# Altium footprint library SparkFun.PCBLIB: 674 footprints (part 39 of 44)
Each footprint in its own frame and in the unit in brackets; x right, y up, seen from the top. Pads: shape width x height; smd on the part's side, far side on the other; paste and mask are expansions set on the pad; w line width, h text height; cw(c..) or ccw(c..) is an arc to the next point about the centre after c.
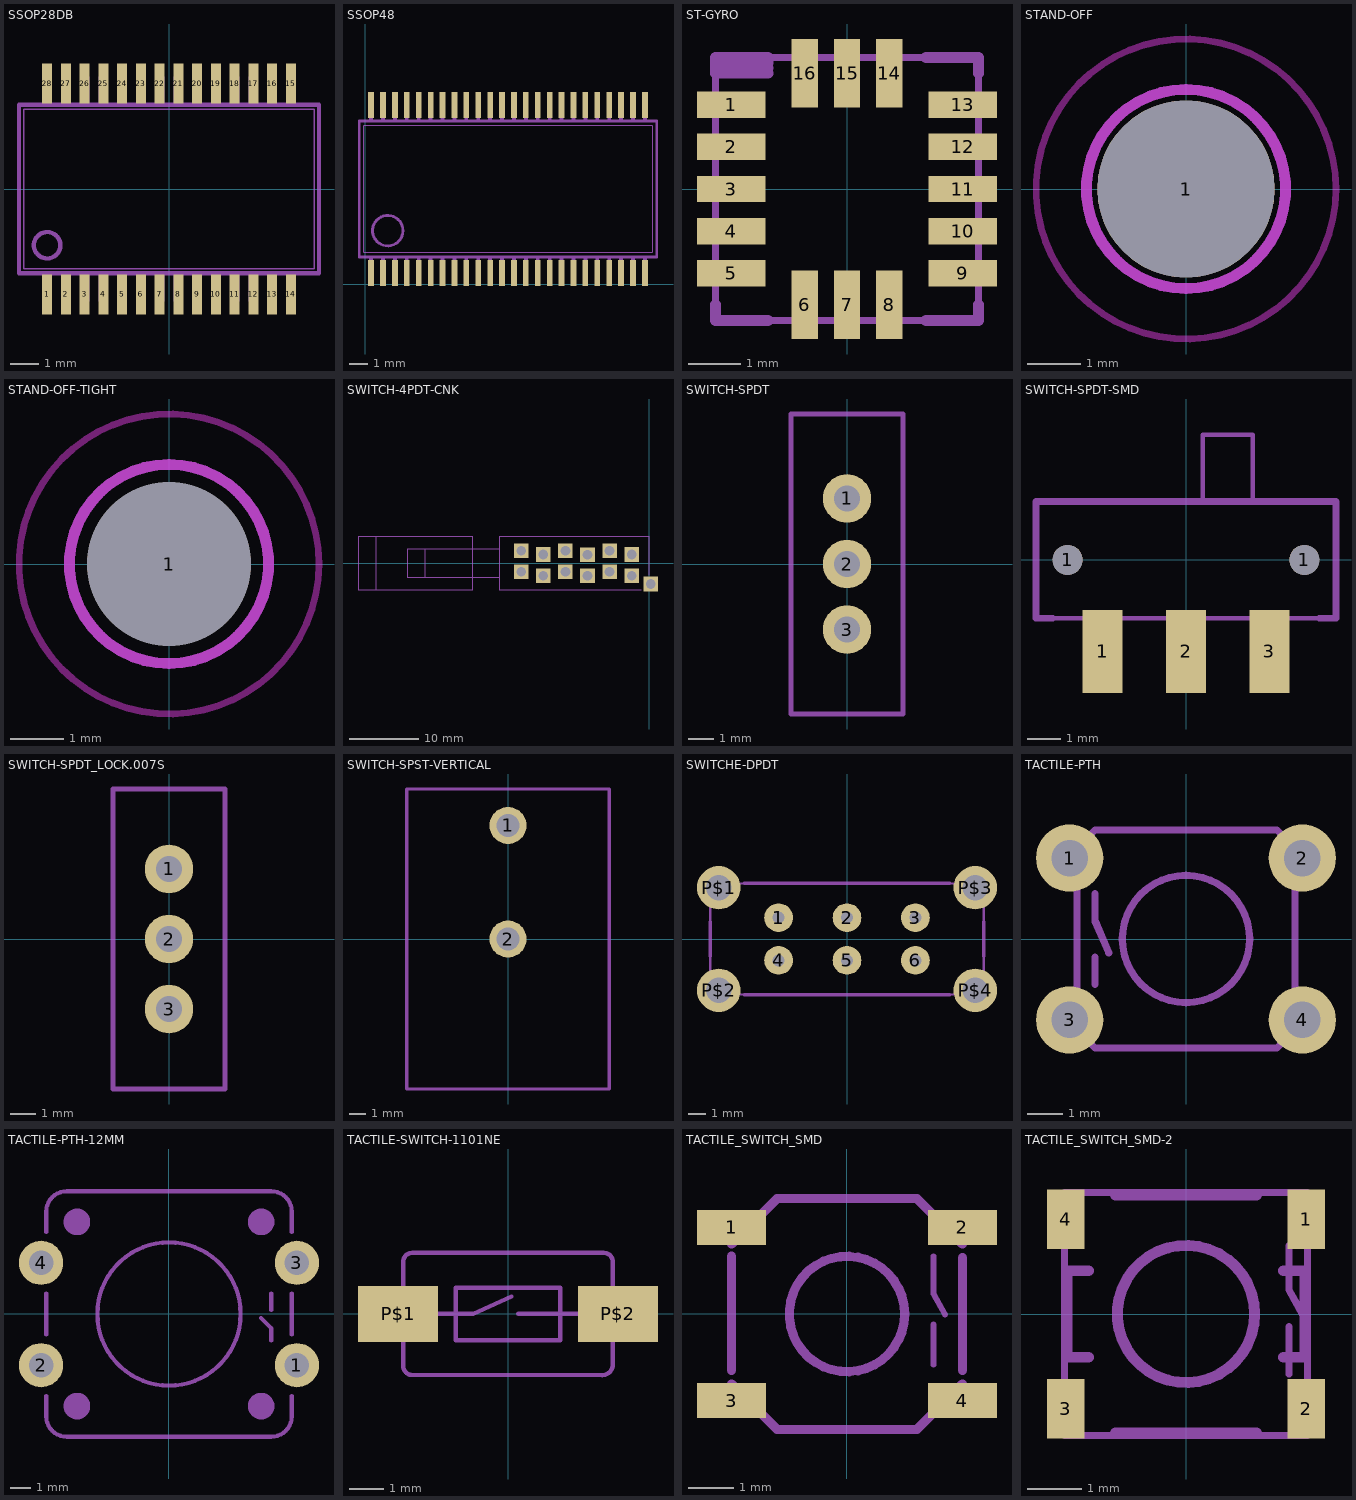
[diagram p38: the footprints below, top view; thin cyan lines are the x and y axes]

## SSOP28DB [mil]
pads (28):
  rect 13.7x55 smd: 1(-166.34,-143.94) 2(-140.75,-143.94) 3(-115.16,-143.94) 4(-89.57,-143.94) 5(-63.98,-143.94) 6(-38.39,-143.94) 7(-12.8,-143.94) 8(12.8,-143.94) 9(38.39,-143.94) 10(63.98,-143.94) 11(89.57,-143.94) 12(115.16,-143.94) 13(140.75,-143.94) 14(166.34,-143.94) 15(166.34,143.94) 16(140.75,143.94) 17(115.16,143.94) 18(89.57,143.94) 19(63.98,143.94) 20(38.39,143.94) 21(12.8,143.94) 22(-12.8,143.94) 23(-38.39,143.94) 24(-63.98,143.94) 25(-89.57,143.94) 26(-115.16,143.94) 27(-140.75,143.94) 28(-166.34,143.94)
Mechanical 2:
  circle w6: c-166.34,-76.77 r18.09
  lines w6: -204.72,-115.16 204.72,-115.16 204.72,115.16 -204.72,115.16 -204.72,-115.16
Mechanical 6:
  lines w2: -198.35,-108.78 198.35,-108.78 198.35,108.78 -198.35,108.78 -198.35,-108.78
Mechanical 18:
  rectangle: -172.74,116.76 -159.94,153.54
  rectangle: -172.74,-153.54 -159.94,-116.76
  rectangle: -147.15,-153.54 -134.35,-116.76
  rectangle: -121.56,-153.54 -108.76,-116.76
  rectangle: -147.15,116.76 -134.35,153.54
  rectangle: -121.56,116.76 -108.76,153.54
  rectangle: -95.96,116.76 -83.17,153.54
  rectangle: -70.37,116.76 -57.58,153.54
  rectangle: -44.78,116.76 -31.99,153.54
  rectangle: -19.19,116.76 -6.4,153.54
  rectangle: 6.4,116.76 19.19,153.54
  rectangle: 31.99,116.76 44.78,153.54
  rectangle: 57.58,116.76 70.37,153.54
  rectangle: 83.17,116.76 95.96,153.54
  rectangle: 108.76,116.76 121.56,153.54
  rectangle: 134.35,116.76 147.15,153.54
  rectangle: 159.94,116.76 172.74,153.54
  rectangle: -95.96,-153.54 -83.17,-116.76
  rectangle: -70.37,-153.54 -57.58,-116.76
  rectangle: -44.78,-153.54 -31.99,-116.76
  rectangle: -19.19,-153.54 -6.4,-116.76
  rectangle: 6.4,-153.54 19.19,-116.76
  rectangle: 31.99,-153.54 44.78,-116.76
  rectangle: 57.58,-153.54 70.37,-116.76
  rectangle: 83.17,-153.54 95.96,-116.76
  rectangle: 108.76,-153.54 121.56,-116.76
  rectangle: 134.35,-153.54 147.15,-116.76
  rectangle: 159.94,-153.54 172.74,-116.76

## SSOP48 [mil]
pads (48):
  rect 12x55 smd: 1(12.5,23.5) 2(37.5,23.5) 3(62.5,23.5) 4(87.5,23.5) 5(112.5,23.5) 6(137.5,23.5) 7(162.5,23.5) 8(187.5,23.5) 9(212.5,23.5) 10(237.5,23.5) 11(262.5,23.5) 12(287.5,23.5) 13(312.5,23.5) 14(337.5,23.5) 15(362.5,23.5) 16(387.5,23.5) 17(412.5,23.5) 18(437.5,23.5) 19(462.5,23.5) 20(487.5,23.5) 21(512.5,23.5) 22(537.5,23.5) 23(562.5,23.5) 24(587.5,23.5) 25(587.5,376.5) 26(562.5,376.5) 27(537.5,376.5) 28(512.5,376.5) 29(487.5,376.5) 30(462.5,376.5) 31(437.5,376.5) 32(412.5,376.5) 33(387.5,376.5) 34(362.5,376.5) 35(337.5,376.5) 36(312.5,376.5) 37(287.5,376.5) 38(262.5,376.5) 39(237.5,376.5) 40(212.5,376.5) 41(187.5,376.5) 42(162.5,376.5) 43(137.5,376.5) 44(112.5,376.5) 45(87.5,376.5) 46(62.5,376.5) 47(37.5,376.5) 48(12.5,376.5)
Mechanical 2:
  circle w6: c47.5,112.5 r32
  lines w2: -2.52,67.48 602.52,67.48 602.52,332.52 -2.52,332.52 -2.52,67.48
  lines w6: -12.52,57.48 612.52,57.48 612.52,342.52 -12.52,342.52 -12.52,57.48
Mechanical 18:
  rectangle: 8.5,344.5 16.5,377.5
  rectangle: 33.5,344.5 41.5,377.5
  rectangle: 58.5,344.5 66.5,377.5
  rectangle: 83.5,344.5 91.5,377.5
  rectangle: 108.5,344.5 116.5,377.5
  rectangle: 133.5,344.5 141.5,377.5
  rectangle: 158.5,344.5 166.5,377.5
  rectangle: 183.5,344.5 191.5,377.5
  rectangle: 208.5,344.5 216.5,377.5
  rectangle: 233.5,344.5 241.5,377.5
  rectangle: 258.5,344.5 266.5,377.5
  rectangle: 283.5,344.5 291.5,377.5
  rectangle: 308.5,344.5 316.5,377.5
  rectangle: 333.5,344.5 341.5,377.5
  rectangle: 358.5,344.5 366.5,377.5
  rectangle: 383.5,344.5 391.5,377.5
  rectangle: 408.5,344.5 416.5,377.5
  rectangle: 433.5,344.5 441.5,377.5
  rectangle: 458.5,344.5 466.5,377.5
  rectangle: 483.5,344.5 491.5,377.5
  rectangle: 508.5,344.5 516.5,377.5
  rectangle: 533.5,344.5 541.5,377.5
  rectangle: 558.5,344.5 566.5,377.5
  rectangle: 583.5,344.5 591.5,377.5
  rectangle: 583.5,22.5 591.5,55.5
  rectangle: 558.5,22.5 566.5,55.5
  rectangle: 533.5,22.5 541.5,55.5
  rectangle: 508.5,22.5 516.5,55.5
  rectangle: 483.5,22.5 491.5,55.5
  rectangle: 458.5,22.5 466.5,55.5
  rectangle: 433.5,22.5 441.5,55.5
  rectangle: 408.5,22.5 416.5,55.5
  rectangle: 383.5,22.5 391.5,55.5
  rectangle: 358.5,22.5 366.5,55.5
  rectangle: 333.5,22.5 341.5,55.5
  rectangle: 308.5,22.5 316.5,55.5
  rectangle: 283.5,22.5 291.5,55.5
  rectangle: 258.5,22.5 266.5,55.5
  rectangle: 233.5,22.5 241.5,55.5
  rectangle: 208.5,22.5 216.5,55.5
  rectangle: 183.5,22.5 191.5,55.5
  rectangle: 158.5,22.5 166.5,55.5
  rectangle: 133.5,22.5 141.5,55.5
  rectangle: 108.5,22.5 116.5,55.5
  rectangle: 83.5,22.5 91.5,55.5
  rectangle: 58.5,22.5 66.5,55.5
  rectangle: 33.5,22.5 41.5,55.5
  rectangle: 8.5,22.5 16.5,55.5

## ST-GYRO [mil]
pads (16):
  rect 51.18x19.69 smd: 1(-86.61,62.99) 2(-86.61,31.5) 3(-86.61,0) 4(-86.61,-31.5) 5(-86.61,-62.99) 9(86.61,-62.99) 10(86.61,-31.5) 11(86.61,0) 12(86.61,31.5) 13(86.61,62.99)
  rect 19.69x51.18 smd: 6(-31.5,-86.61) 7(0,-86.61) 8(31.5,-86.61) 14(31.5,86.61) 15(0,86.61) 16(-31.5,86.61)
Mechanical 2:
  lines w8: -98.43,-86.61 -98.43,-98.43 -59.06,-98.43 ; -59.06,86.61 -98.43,86.61 -98.43,90.55 ; -59.06,90.55 -98.43,90.55 ; -59.06,94.49 -98.43,94.49 ; -59.06,98.43 -98.43,98.43 -98.43,94.49 ; 59.06,-98.43 98.43,-98.43 98.43,-86.61 ; 59.06,98.43 98.43,98.43 98.43,86.61 ; -98.43,90.55 -98.43,94.49
Mechanical 18:
  lines w5: -98.43,-98.43 -98.43,98.43 98.43,98.43 98.43,-98.43 -98.43,-98.43

## STAND-OFF [mil]
pads (1):
  round 130 hole 130: 1(0,0)
Keep-Out Layer:
  circle w5: c0,0 r110
Mechanical 10 keep-out:
  lines w8: 0,-73 ccw(c0,0) 0,73 ccw(c0,0) 0,-73
Mechanical 11 keep-out:
  lines w8: 0,-73 ccw(c0,0) 0,73 ccw(c0,0) 0,-73

## STAND-OFF-TIGHT [mil]
pads (1):
  round 120 hole 120: 1(0,0)
Keep-Out Layer:
  circle w5: c0,0 r110
Mechanical 10 keep-out:
  lines w8: 0,-73 ccw(c0,0) 0,73 ccw(c0,0) 0,-73
Mechanical 11 keep-out:
  lines w8: 0,-73 ccw(c0,0) 0,73 ccw(c0,0) 0,-73

## SWITCH-4PDT-CNK [mil]
pads (13):
  rect 82.68x82.68 hole 55.12: P$13(8,-118) PP$1(-725,-49) PP$2(-600,-71) PP$3(-475,-49) PP$4(-350,-71) PP$5(-225,-49) PP$6(-100,-71) PP$7(-725,71) PP$8(-600,49) PP$9(-475,71) PP$10(-350,47) PP$11(-225,71) PP$12(-100,49)
Mechanical 2:
  lines w5: -850,-150 -46,-150 ; -850,-79 -850,79 ; -850,150 0,150 0,-67
Mechanical 16:
  lines w5: -1272,-79 -1271,-79 ; -850,-150 -850,-79 ; -850,79 -850,150
Mechanical 18:
  rectangle: -745.9,-71.6 -704.9,-48.6
  rectangle: -620.5,-71.6 -579.5,-48.6
  rectangle: -495.1,-71.6 -454.1,-48.6
  rectangle: -369.7,-71.6 -328.7,-48.6
  rectangle: -244.3,-71.6 -203.3,-48.6
  rectangle: -118.9,-71.6 -77.9,-48.6
  rectangle: -745.9,47.9 -704.9,70.9
  rectangle: -620.5,47.9 -579.5,70.9
  rectangle: -495.1,47.9 -454.1,70.9
  rectangle: -369.7,47.9 -328.7,70.9
  rectangle: -244.3,47.9 -203.3,70.9
  rectangle: -118.9,47.9 -77.9,70.9
  region: 7.5,-138.5 7.5,-97.5 -15.5,-97.5 -15.5,-138.5
  lines w5: -1272,-79 -1272,79 ; -850,-79 -1271,-79 -1370,-79 -1370,79 -1272,79 ; -850,79 -1272,79 ; -1550,-150 -1550,150 ; -1550,-150 -1000,-150 -1000,150 -1550,150 ; -1550,-150 -1650,-150 -1650,150 -1550,150

## SWITCH-SPDT [mil]
pads (3):
  round 74 hole 40: 1(0,100) 2(0,0) 3(0,-100)
Mechanical 2:
  lines w8: -85.63,-228.94 -85.63,228.94 85.63,228.94 85.63,-228.94 -85.63,-228.94

## SWITCH-SPDT-SMD [mil]
pads (5):
  round 35.43 hole 35.43: 1(-139.76,0) 1(139.76,0)
  rect 47.24x98.43 smd: 1(-98.43,-108.27) 2(0,-108.27) 3(98.43,-108.27)
Mechanical 2:
  lines w8: -157.48,-68.9 -177.17,-68.9 -177.17,68.9 177.17,68.9 177.17,-68.9 157.48,-68.9
Mechanical 18:
  lines w5: 19.69,68.9 78.74,68.9 ; 19.69,68.9 -177.17,68.9 -177.17,-68.9 177.17,-68.9 177.17,68.9 78.74,68.9 ; 19.69,68.9 19.69,147.64 78.74,147.64 78.74,68.9

## SWITCH-SPDT_LOCK.007S [mil]
pads (3):
  round 74 hole 40: 1(0,107) 2(0,0) 3(0,-107)
Mechanical 2:
  lines w8: -85.63,-228.94 -85.63,228.94 85.63,228.94 85.63,-228.94 -85.63,-228.94
Mechanical 18:
  rectangle: -9,-12 9,12
  rectangle: -9,88 9,112
  rectangle: -9,-112 9,-88

## SWITCH-SPST-VERTICAL [mil]
pads (2):
  round 90 hole 55.12: 1(0,275.59) 2(0,0)
Mechanical 2:
  lines w8: -246.06,-364.17 246.06,-364.17 246.06,364.17 -246.06,364.17 -246.06,-364.17

## SWITCHE-DPDT [mil]
pads (10):
  round 66 hole 27.56: 1(-157.48,49.21) 2(0,49.21) 3(157.48,49.21) 4(-157.48,-49.21) 5(0,-49.21) 6(157.48,-49.21)
  round 100 hole 59.06: P$1(-295.28,118.11) P$2(-295.28,-118.11) P$3(295.28,118.11) P$4(295.28,-118.11)
Mechanical 2:
  lines w8: -314.96,-39.37 -314.96,39.37 ; -236.22,-127.95 236.22,-127.95 ; -236.22,127.95 236.22,127.95 ; 314.96,-39.37 314.96,39.37
Mechanical 18:
  lines w5: -314.96,-127.95 -314.96,127.95 314.96,127.95 314.96,-127.95 -314.96,-127.95

## TACTILE-PTH [mil]
pads (4):
  round 74 hole 40: 1(-128,89) 2(128,89) 3(-128,-89) 4(128,-89)
Mechanical 2:
  circle w8: c0,0 r70
  lines w8: -120,-40 -120,40.47 ; -85,-120 85,-120 ; -85,120 85,120 ; 120,-40 120,39.29
Mechanical 18:
  lines w8: -120,-40 -120,-100 -100,-120 -85,-120 ; -120,40 -120,100 -100,120 -85,120 ; -100,-50 -100,-20 ; -100,50 -100,20 -85,-15 ; 85,-120 100,-120 120,-100 120,-40 ; 85,120 100,120 120,100 120,40

## TACTILE-PTH-12MM [mil]
pads (4):
  round 85 hole 47.24: 1(246.06,-98.43) 2(-246.06,-98.43) 3(246.06,98.43) 4(-246.06,98.43)
Mechanical 2:
  circle w8: c0,0 r137.8
  circle w27.56: c-177.17,177.17 r11.81
  circle w27.56: c177.17,177.17 r11.81
  circle w27.56: c177.17,-177.17 r11.81
  circle w27.56: c-177.17,-177.17 r11.81
  lines w8: -236.22,-157.48 -236.22,-196.85 ccw(c-196.85,-196.85) -196.85,-236.22 196.85,-236.22 ccw(c196.85,-196.85) 236.22,-196.85 236.22,-157.48 ; -236.22,-39.37 -236.22,39.37 ; -236.22,157.48 -236.22,196.85 cw(c-196.85,196.85) -196.85,236.22 196.85,236.22 cw(c196.85,196.85) 236.22,196.85 236.22,157.48 ; 236.22,-39.37 236.22,39.37
Mechanical 18:
  lines w8: 177.17,-7.87 196.85,-27.56 196.85,-51.18 ; 196.85,7.87 196.85,39.37

## TACTILE-SWITCH-1101NE [mil]
pads (2):
  rect 90.55x62.99 smd: P$1(-124.02,0) P$2(124.02,0)
Mechanical 2:
  lines w5: -118.11,-43.31 -118.11,-59.06 ccw(c-108.27,-59.06) -108.27,-68.9 104.33,-68.9 ccw(c106.3,-57.09) 118.11,-59.06 118.11,-43.31 ; -118.11,43.31 -118.11,59.06 cw(c-108.27,59.06) -108.27,68.9 108.27,68.9 cw(c108.27,59.06) 118.11,59.06 118.11,43.31 ; -59.06,-29.53 59.06,-29.53 59.06,29.53 -59.06,29.53 -59.06,-29.53
Mechanical 18:
  lines w5: -118.11,-43.31 -118.11,43.31 ; -78.74,0 -39.37,0 3.94,19.69 ; 11.81,0 78.74,0 ; 118.11,-43.31 118.11,43.31

## TACTILE_SWITCH_SMD [mil]
pads (4):
  rect 60x30 smd: 1(-100,75) 2(100,75) 3(-100,-75) 4(100,-75)
Mechanical 2:
  circle w8: c0,0 r50
  lines w8: -100,-48.82 -100,50 ; -60.63,-100 60.63,-100 ; -60.63,100 60.63,100 ; 100,-48.82 100,48.82
Mechanical 18:
  lines w5: 75,-43.9 75,-9.06 ; 75,50 75,17.52 85.04,-0.39
  lines w8: -100,-60.63 -60.63,-100 ; -100,60.63 -60.63,100 ; 60.63,-100 100,-60.63 ; 60.63,100 100,60.63

## TACTILE_SWITCH_SMD-2 [mil]
pads (4):
  rect 27.56x43.31 smd: 1(87.6,68.9) 2(87.6,-68.9) 3(-87.6,-68.9) 4(-87.6,68.9)
Mechanical 2:
  circle w8: c0,0 r50
  lines w8: -70.87,-31.5 -86.61,-31.5 -86.61,31.5 -70.87,31.5 ; -51.18,-86.61 51.18,-86.61 ; -51.18,86.61 51.18,86.61 ; 70.87,-31.5 86.61,-31.5 86.61,31.5 70.87,31.5
Mechanical 18:
  lines w5: 75,-43.9 75,-9.06 ; 75,50 75,17.52 85.04,-0.39 ; -88.58,-88.58 88.58,-88.58 88.58,88.58 -88.58,88.58 -88.58,-88.58